# Altium footprint library Semi-ATE.PcbLib: 155 footprints (part 4 of 10)
Each footprint in its own frame and in the unit in brackets; x right, y up, seen from the top. Pads: shape width x height; smd on the part's side, far side on the other; paste and mask are expansions set on the pad; w line width, h text height; cw(c..) or ccw(c..) is an arc to the next point about the centre after c.
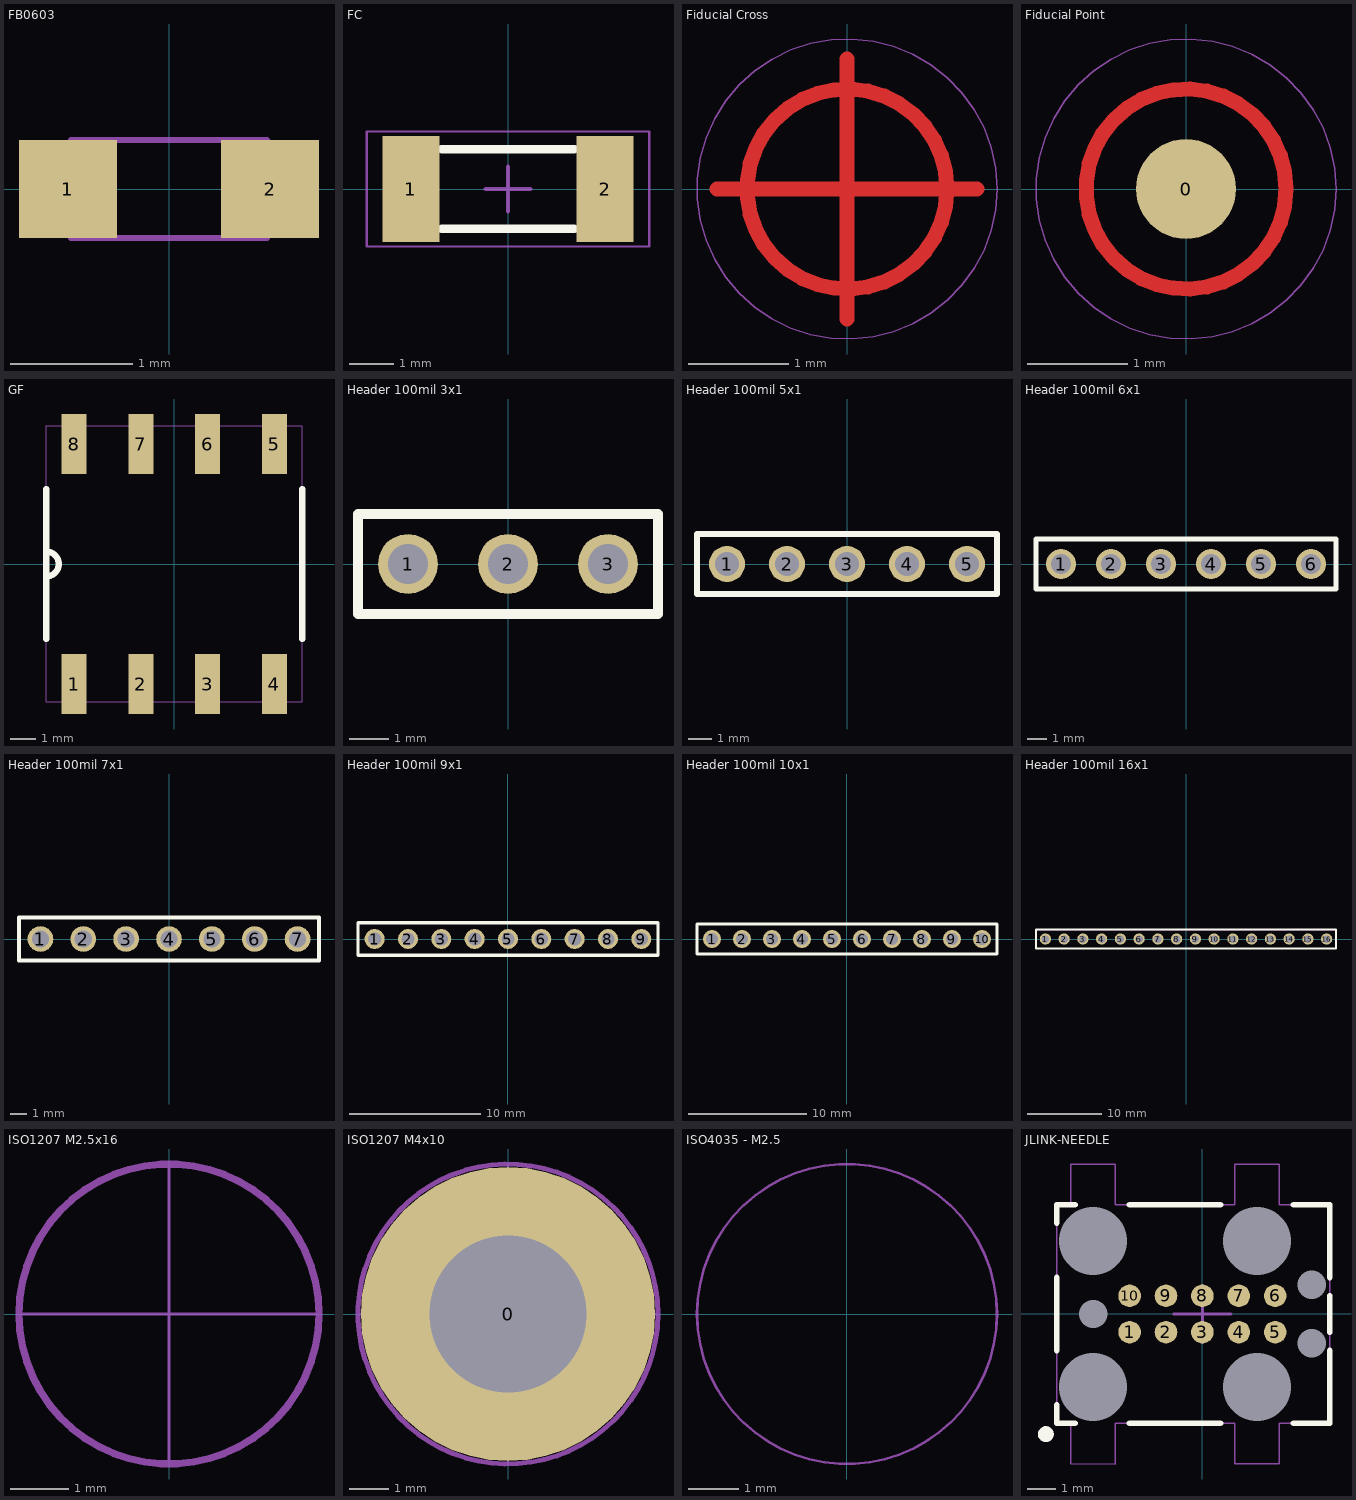
[diagram p3: the footprints below, top view; thin cyan lines are the x and y axes]

## FB0603 [mm] "SMT Ferrite Bead 0603"
pads (2):
  rect 0.8x0.8 smd: 1(-0.825,0) 2(0.825,0)
Top Designator:
  text ".Designator" at -7.618,-0.508 h1.52
Top 3D Body:
  lines w0.05: -0.8,-0.4 0.8,-0.4 0.8,0.4 -0.8,0.4 -0.8,-0.4
3D body "L0603.STEP": height 0.8, standoff 0, extent -0.8,-0.4 0.8,0.4

## FC [mm]
height 0.9
pads (2):
  rect 1.3x2.4 smd: 1(-2.2,0) 2(2.2,0)
Top Overlay:
  lines w0.2: -1.5,-0.9 1.5,-0.9 ; -1.5,0.9 1.5,0.9
Top Designator:
  text ".Designator" at -7.618,-0.508 h1.52
Top 3D Body:
  lines w0.05: -3.2,-1.3 -3.2,1.3 3.2,1.3 3.2,-1.3 -3.2,-1.3
Bottom 3D Body:
  lines w0.1: -2.5,-0.95 -2.5,0.95 2.5,0.95 2.5,-0.95 -2.5,-0.95
Bottom Gold Plating:
  lines w0.1: -0.5,0 0.5,0 ; 0,-0.5 0,0.5
3D body: height 0.9, standoff 0, extent -2.5,-0.95 2.5,0.95

## Fiducial Cross [mm]
Top Layer:
  circle w0.15: c0,0 r1
  lines w0.15: -1.3,0 1.3,0 ; 0,-1.3 0,1.3
Top Solder:
  region: 0,-1.5 -0.148,-1.5 -0.438,-1.442 -0.711,-1.329 -0.956,-1.165 -1.165,-0.956 -1.329,-0.711 -1.442,-0.438 -1.5,-0.148 -1.5,0 -1.5,0.148 -1.442,0.438 -1.329,0.711 -1.165,0.956 -0.956,1.165 -0.711,1.329 -0.438,1.442 -0.148,1.5 0,1.5 0.148,1.5 0.438,1.442 0.711,1.329 0.956,1.165 1.165,0.956 1.329,0.711 1.442,0.438 1.5,0.148 1.5,0 1.5,-0.148 1.442,-0.438 1.329,-0.711 1.165,-0.956 0.956,-1.165 0.711,-1.329 0.438,-1.442 0.148,-1.5
Top Designator:
  text ".Designator" at -7.618,-0.508 h1.52
Bottom Gold Plating:
  circle w0.013: c0,0 r1.5

## Fiducial Point [mm]
pads (1):
  round 1 smd paste+0 mask+0: 0(0,0)
Top Layer:
  circle w0.15: c0,0 r1
Top Solder:
  region: 0,-1.5 -0.148,-1.5 -0.438,-1.442 -0.711,-1.329 -0.956,-1.165 -1.165,-0.956 -1.329,-0.711 -1.442,-0.438 -1.5,-0.148 -1.5,0 -1.5,0.148 -1.442,0.438 -1.329,0.711 -1.165,0.956 -0.956,1.165 -0.711,1.329 -0.438,1.442 -0.148,1.5 0,1.5 0.148,1.5 0.438,1.442 0.711,1.329 0.956,1.165 1.165,0.956 1.329,0.711 1.442,0.438 1.5,0.148 1.5,0 1.5,-0.148 1.442,-0.438 1.329,-0.711 1.165,-0.956 0.956,-1.165 0.711,-1.329 0.438,-1.442 0.148,-1.5
Top Designator:
  text ".Designator" at -7.618,-0.508 h1.52
Bottom Gold Plating:
  circle w0.013: c0,0 r1.5

## GF [mm] "APEX 8-pin Surface Mount DIP"
pads (8):
  rect 1x2.4 smd: 1(-4.005,-4.8) 2(-1.335,-4.8) 3(1.335,-4.8) 4(4.005,-4.8) 5(4.005,4.8) 6(1.335,4.8) 7(-1.335,4.8) 8(-4.005,4.8)
Top Overlay:
  lines w0.254: -5.12,-3 -5.12,3 ; -5.12,-0.5 ccw(c-5.12,0) -5.12,0.5 ; 5.12,-3 5.12,3
Top Designator:
  text ".Designator" at -7.617,-0.508 h1.52
Top 3D Body:
  lines w0.05: -5.12,-5.52 5.12,-5.52 5.12,5.52 -5.12,5.52 -5.12,-5.52
3D body "GF.STEP": height 3.58, standoff 0, extent -5.12,-5.52 5.12,5.52

## Header 100mil 3x1 [mil] "HMTSW-103-07-G-S-240"
pads (3):
  round 60 hole 40: 1(-100,0) 2(0,0) 3(100,0)
Top Overlay:
  lines w10: -150,-50 150,-50 150,50 -150,50 -150,-50
Top Designator:
  text ".Designator" at -299.9,-19.99 h60
Top 3D Body:
  lines w1.97: -150,-50 150,-50 150,50 -150,50 -150,-50
3D body "HMTSW-103-07-G-S-240.STEP": height 340, standoff -90, extent -149.99,-48.99 150.01,49

## Header 100mil 5x1 [mil] "HMTSW-105-07-G-S-240"
pads (5):
  round 60 hole 40: 1(-200,0) 2(-100,0) 3(0,0) 4(100,0) 5(200,0)
Top Overlay:
  lines w10: -250,-50 -250,50 250,50 250,-50 -250,-50
  text "." at -219.69,-78.74 h39.37
Top Designator:
  text ".Designator" at -299.9,-36.86 h60
Top 3D Body:
  lines w1.97: -250,-50 250,-50 250,50 -250,50 -250,-50
3D body "HMTSW-105-07-G-S-240.STEP": height 340, standoff -90, extent -249.99,-48.99 250.01,49

## Header 100mil 6x1 [mil] "HMTSW-106-07-G-S-240"
pads (6):
  round 60 hole 40: 1(-250,0) 2(-150,0) 3(-50,0) 4(50,0) 5(150,0) 6(250,0)
Top Overlay:
  lines w10: -300,-50 -300,50 300,50 300,-50 -300,-50
  text "." at -252.76,-70.87 h39.37
Top Designator:
  text ".Designator" at -299.9,-32.93 h60
Top 3D Body:
  lines w1.97: -300,-50 -300,50 300,50 300,-50 -300,-50
3D body "HMTSW-106-07-G-S-240.STEP": height 340, standoff -90, extent -299.99,-48.99 300.01,49

## Header 100mil 7x1 [mil] "HMTSW-107-07-G-S-240"
pads (7):
  round 60 hole 40: 1(-300,0) 2(-200,0) 3(-100,0) 4(0,0) 5(100,0) 6(200,0) 7(300,0)
Top Overlay:
  lines w10: -350,-50 -350,50 350,50 350,-50 -350,-50
  text "." at -302.76,-70.87 h39.37
Top Designator:
  text ".Designator" at -299.9,-32.93 h60
Top 3D Body:
  lines w1.97: -350,-50 -350,50 350,50 350,-50 -350,-50
3D body "HMTSW-107-07-G-S-240.STEP": height 340, standoff -90, extent -349.99,-48.99 350.01,49

## Header 100mil 9x1 [mil] "HMTSW-109-07-G-S-240"
pads (9):
  round 60 hole 40: 1(-400,0) 2(-300,0) 3(-200,0) 4(-100,0) 5(0,0) 6(100,0) 7(200,0) 8(300,0) 9(400,0)
Top Overlay:
  lines w10: -449.99,47.24 -449.99,-48.99 450.01,-48.99 450.01,49 -449.99,49
  text "." at -402.76,-70.87 h39.37
Top Designator:
  text ".Designator" at -299.9,-33.42 h60
Top 3D Body:
  lines w1.97: -449.99,-48.99 450.01,-48.99 450.01,49 -449.99,49 -449.99,-48.99
3D body "HMTSW-109-07-G-S-240.STEP": height 340, standoff -90, extent -449.99,-48.99 450.01,49

## Header 100mil 10x1 [mil] "HMTSW-110-07-G-S-240"
pads (10):
  round 60 hole 40: 1(-450,0) 2(-350,0) 3(-250,0) 4(-150,0) 5(-50,0) 6(50,0) 7(150,0) 8(250,0) 9(350,0) 10(450,0)
Top Overlay:
  lines w10: -500,-50 -500,50 500,50 500,-50 -500,-50
  text "." at -452.76,-70.87 h39.37
Top Designator:
  text ".Designator" at -299.9,-32.93 h60
Top 3D Body:
  lines w1.97: -500,-50 -500,50 500,50 500,-50 -500,-50
3D body "HMTSW-110-07-G-S-240.STEP": height 340, standoff -90, extent -499.99,-48.99 500.01,49

## Header 100mil 16x1 [mil] "HMTSW-116-07-G-S-240"
pads (16):
  round 60 hole 40: 1(-750,0) 2(-650,0) 3(-550,0) 4(-450,0) 5(-350,0) 6(-250,0) 7(-150,0) 8(-50,0) 9(50,0) 10(150,0) 11(250,0) 12(350,0) 13(450,0) 14(550,0) 15(650,0) 16(750,0)
Top Overlay:
  lines w10: -800,-50 -800,50 800,50 800,-50 -750,-50 -800,-50
  text "." at -752.76,-70.87 h39.37
Top Designator:
  text ".Designator" at -299.9,-32.93 h60
Top 3D Body:
  lines w1.97: -800,-50 -800,50 800,50 800,-50 -800,-50
3D body "HMTSW-116-07-G-S-240.STEP": height 340, standoff -90, extent -799.99,-48.99 800,49

## ISO1207 M2.5x16 [mm] "SlottedCheese Head Screw M2.5x16"
Top Courtyard:
  circle w0.127: c0,0 r2.57
Top Designator:
  text ".Designator" at -7.618,-0.508 h1.52
Top Component Center:
  lines w0.05: -2.5,0 2.5,0 ; 0,-2.5 0,2.5
3D body "ISO1207-M2.5x16.STEP": height 1.8, standoff -16, extent -2.25,-2.25 2.25,2.25

## ISO1207 M4x10 [mm] "SlottedCheese Head Screw M4x10"
pads (1):
  round 7.5 hole 4 unplated: 0(0,0)
Top Courtyard:
  circle w0.127: c0,0 r3.825
Top Designator:
  text ".Designator" at -7.618,-0.508 h1.52
Top Component Center:
  lines w0.05: -3.749,0 3.75,0 ; 0,-3.748 0,3.75
3D body "ISO1207-M4x10.STEP": height 2.6, standoff -10, extent -3.5,-3.5 3.5,3.5

## ISO4035 - M2.5 [mm]
Top Designator:
  text ".Designator" at -7.617,-0.508 h1.52
Top Component Outline:
  circle w0.05: c0,0 r2.962
3D body "ISO4035-M2.5.STEP": height 14.4, standoff 12.8, extent -2.5,-2.887 2.5,2.887

## JLINK-NEEDLE [mil]
pads (17):
  round 31 smd paste-31: 1(-100,-25) 2(-50,-25) 3(0,-25) 4(50,-25) 5(100,-25) 6(100,25) 7(50,25) 8(0,25) 9(-50,25) 10(-100,25)
  round 0 hole 93.5 unplated: M1(-150,100) M2(-150,-100) M3(75,100) M4(75,-100)
  round 0 hole 39 unplated: P1(-150,0) P2(150,40) P3(150,-40)
Top Overlay:
  circle w11.81: c-215,-165 r5
  circle w11.81: c-215,-165 r5
  lines w7.87: -200,-125 -200,-150 -175,-150 ; -200,-50 -200,50 ; -200,125 -200,150 -175,150 ; -100,-150 25,-150 ; -100,150 25,150 ; 125,-150 175,-150 175,-75 175,-50 ; 125,150 175,150 175,75 175,50 ; 175,-25 175,25
Top Designator:
  text ".Designator" at -323.39,-19.99 h60
Top 3D Body:
  lines w1.97: -200,-150 -200,150 ; -200,-150 -180.5,-150 ; -200,-150 -180.5,-150 ; -200,-150 -200,150 ; -200,150 -180.5,150 ; -200,150 -180.5,150 ; -180.5,-206 -119.5,-206 ; -180.5,-206 -180.5,-150 ; -180.5,-206 -180.5,-150 ; -180.5,-206 -119.5,-206 ; -180.5,150 -180.5,206 ; -180.5,150 -180.5,206 ; -180.5,206 -119.5,206 ; -180.5,206 -119.5,206 ; -119.5,-206 -119.5,-150 ; -119.5,-206 -119.5,-150 ; -119.5,-150 44.5,-150 ; -119.5,-150 44.5,-150 ; -119.5,150 44.5,150 ; -119.5,150 -119.5,206 ; -119.5,150 -119.5,206 ; -119.5,150 44.5,150 ; 44.5,-206 105.5,-206 ; 44.5,-206 44.5,-150 ; 44.5,-206 44.5,-150 ; 44.5,-206 105.5,-206 ; 44.5,150 44.5,206 ; 44.5,150 44.5,206 ; 44.5,206 105.5,206 ; 44.5,206 105.5,206 ; 105.5,-206 105.5,-150 ; 105.5,-206 105.5,-150 ; 105.5,-150 175,-150 ; 105.5,-150 175,-150 ; 105.5,150 175,150 ; 105.5,150 105.5,206 ; 105.5,150 105.5,206 ; 105.5,150 175,150 ; 175,-150 175,150 ; 175,-150 175,150
Bottom Gold Plating:
  lines w3.94: -39.37,0 39.37,0 ; 0,-39.37 0,39.37